# Altium footprint library Cyberdeck.PcbLib: 261 footprints (part 8 of 17)
Each footprint in its own frame and in the unit in brackets; x right, y up, seen from the top. Pads: shape width x height; smd on the part's side, far side on the other; paste and mask are expansions set on the pad; w line width, h text height; cw(c..) or ccw(c..) is an arc to the next point about the centre after c.
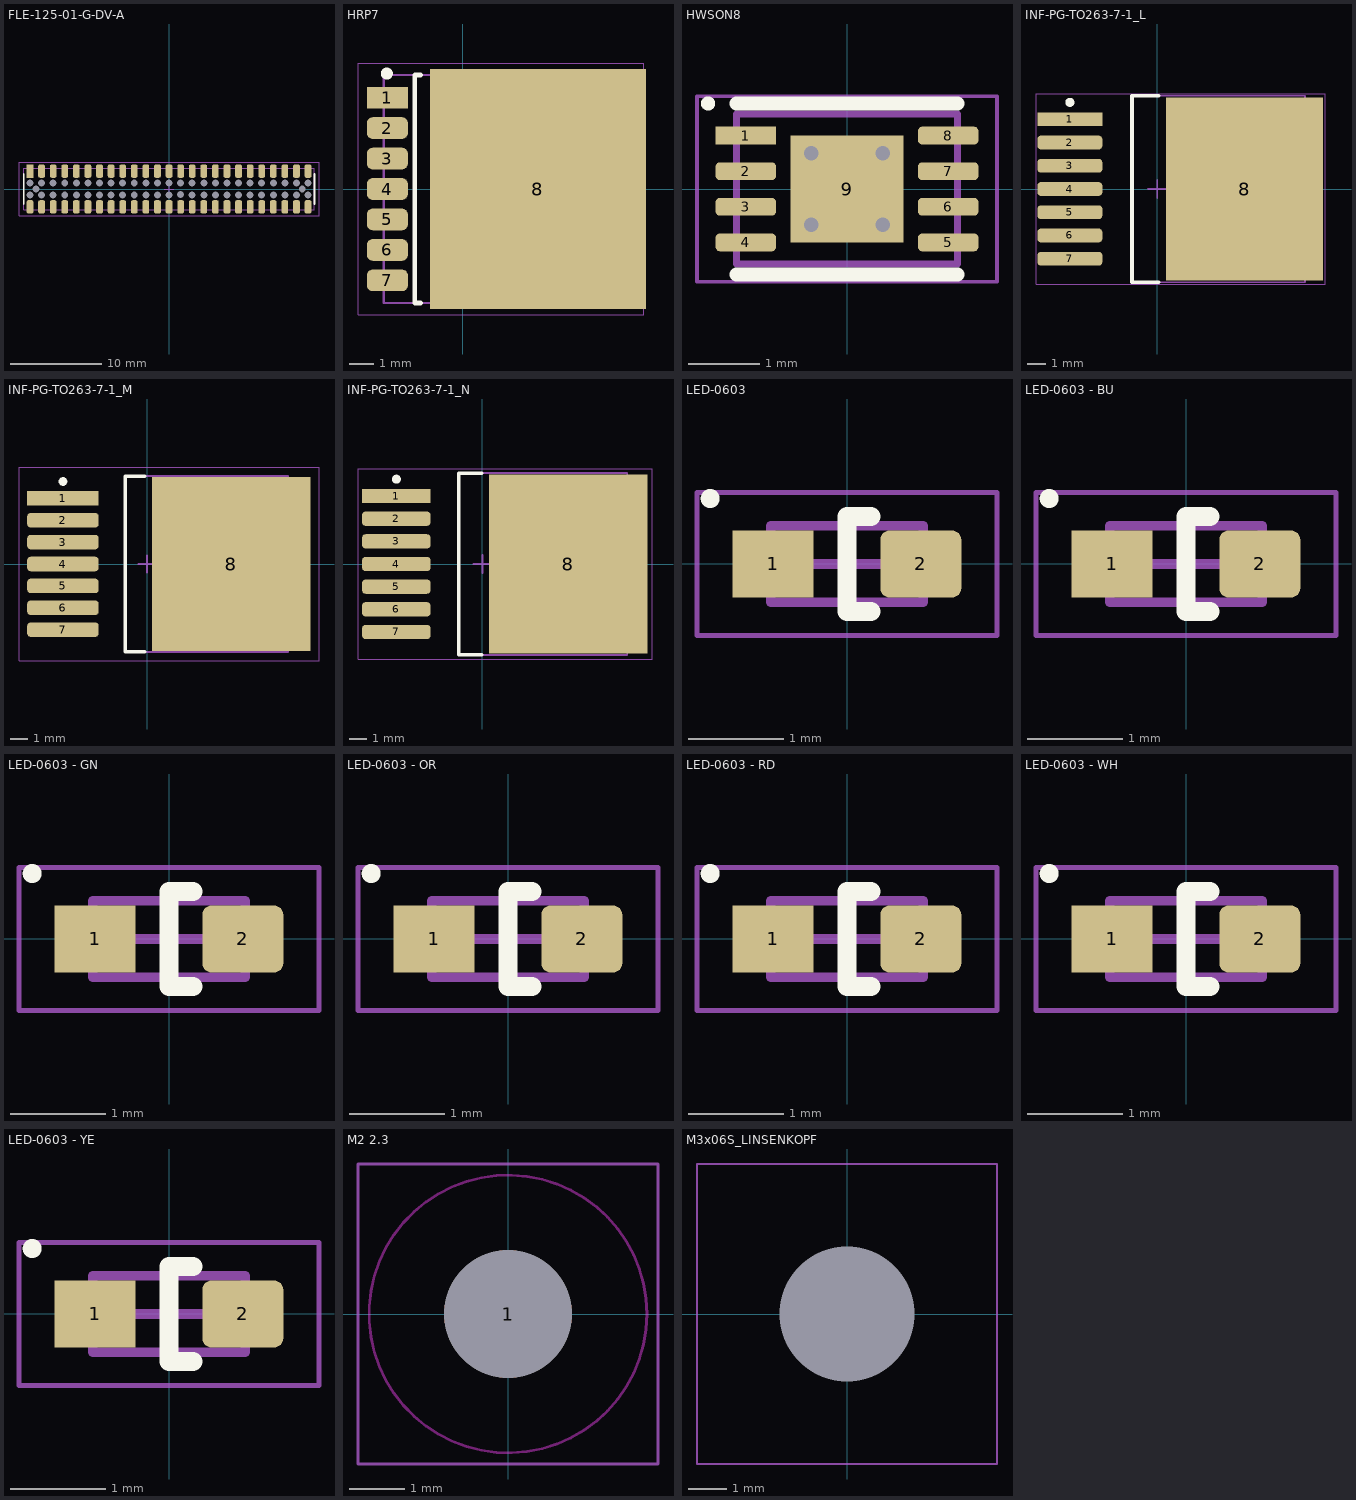
[diagram p7: the footprints below, top view; thin cyan lines are the x and y axes]

## FLE-125-01-G-DV-A [mil] "FLE-125-01-G-DV-A"
height 179.13
pads (102):
  rect 29x57 smd mask+2: 1(-600,77)
  rrect50% 29x57 smd mask+2: 2(-600,-77) 3(-550,77) 4(-550,-77) 5(-500,77) 6(-500,-77) 7(-450,77) 8(-450,-77) 9(-400,77) 10(-400,-77) 11(-350,77) 12(-350,-77) 13(-300,77) 14(-300,-77) 15(-250,77) 16(-250,-77) 17(-200,77) 18(-200,-77) 19(-150,77) 20(-150,-77) 21(-100,77) 22(-100,-77) 23(-50,77) 24(-50,-77) 25(0,77) 26(0,-77) 27(50,77) 28(50,-77) 29(100,77) 30(100,-77) 31(150,77) 32(150,-77) 33(200,77) 34(200,-77) 35(250,77) 36(250,-77) 37(300,77) 38(300,-77) 39(350,77) 40(350,-77) 41(400,77) 42(400,-77) 43(450,77) 44(450,-77) 45(500,77) 46(500,-77) 47(550,77) 48(550,-77) 49(600,77) 50(600,-77)
  round 0 hole 30 unplated: 51(-600,-25) 51(-600,25) 51(-575,0) 51(-550,-25) 51(-550,25) 51(-500,-25) 51(-500,25) 51(-450,-25) 51(-450,25) 51(-400,-25) 51(-400,25) 51(-350,-25) 51(-350,25) 51(-300,-25) 51(-300,25) 51(-250,-25) 51(-250,25) 51(-200,-25) 51(-200,25) 51(-150,-25) 51(-150,25) 51(-100,-25) 51(-100,25) 51(-50,-25) 51(-50,25) 51(0,-25) 51(0,25) 51(50,-23) 51(50,25) 51(100,-25) 51(100,25) 51(150,-25) 51(150,25) 51(200,-25) 51(200,25) 51(250,-25) 51(250,25) 51(300,-25) 51(300,25) 51(350,-25) 51(350,25) 51(400,-25) 51(400,25) 51(450,-25) 51(450,25) 51(500,-25) 51(500,25) 51(550,-25) 51(550,25) 51(600,-25) 51(600,25) 52(575,0)
Top Overlay:
  lines w7.87: -627.25,-65.5 -627.25,65.5 ; 627.25,-65.5 627.25,65.5
Assembly Top:
  lines w3.94: -627.25,-90.45 627.25,-90.45 627.25,90.45 -627.25,90.45 -627.25,-90.45
Courtyard Top:
  lines w1.97: -647.5,-115.5 647.25,-115.5 647.25,115.5 -647.5,115.5 -647.5,-115.5
  lines w3.94: -19.68,0 19.68,0 ; 0,-19.68 0,19.68
3D body "FLE-125-01-G-DV-A.stp": height 179.5, standoff -22.5, extent -627.25,-90.45 627.25,90.45

## HRP7 [mm] "HRP7"
height 2.1
pads (8):
  rect 1.7x0.9 smd: 1(-3.137,3.81)
  rrect50% 1.7x0.9 smd: 2(-3.137,2.54) 3(-3.137,1.27) 4(-3.137,0) 5(-3.137,-1.27) 6(-3.137,-2.54) 7(-3.137,-3.81)
  rect 9x10 smd: 8(3.137,0)
Top Overlay:
  circle w0.25: c-3.163,4.81 r0.125
  lines w0.2: -1.763,-4.75 -1.994,-4.75 -1.994,4.75 -1.763,4.75
Assembly Top:
  lines w0.1: -3.288,-4.75 -3.288,4.75 7.262,4.75 7.262,-4.75 -3.288,-4.75
Courtyard Top:
  lines w0.05: -4.363,-5.25 -4.363,5.25 7.537,5.25 7.537,-5.25 -4.363,-5.25
  lines w0.1: -0.5,0 0.5,0 ; 0,-0.5 0,0.5
3D body "HRP7.step": height 2.18, standoff 0, extent -3.264,-4.75 7.276,4.75

## HWSON8 [mm] "SON, 8-Leads, Body 2.00x3.00mm, Pitch 0.50mm, Thermal Pad 1.50x1.59mm, IPC Medium Density"
height 0.8
pads (9):
  rect 0.85x0.25 smd: 1(-1.42,0.75)
  rrect50% 0.85x0.25 smd: 2(-1.42,0.25) 3(-1.42,-0.25) 4(-1.42,-0.75) 5(1.42,-0.75) 6(1.42,-0.25) 7(1.42,0.25) 8(1.42,0.75)
  rect 1.59x1.5 smd: 9(0,0)
via -0.5,0.5 diameter 0.5 hole 0.2
via 0.5,0.5 diameter 0.5 hole 0.2
via -0.5,-0.5 diameter 0.5 hole 0.2
via 0.5,-0.5 diameter 0.5 hole 0.2
Top Overlay:
  circle w0.1: c-1.95,1.2 r0.05
  lines w0.2: -1.55,-1.2 1.55,-1.2 ; -1.55,1.2 1.55,1.2
Assembly Top:
  lines w0.1: -1.55,-1.05 -1.55,1.05 1.55,1.05 1.55,-1.05 -1.55,-1.05
Courtyard Top:
  lines w0.05: -2.105,-1.3 -2.105,1.3 2.105,1.3 2.105,-1.3 -2.105,-1.3
  lines w0.1: -0.5,0 0.5,0 ; 0,-0.5 0,0.5
3D body "HWSON8.step": height 0.8, standoff 0, extent -1.551,-1.05 1.551,1.05

## INF-PG-TO263-7-1_L [mm] "DPAK, 8-Leads, Body 10x9.25mm, Pitch 1.27mm, IPC High Density"
height 4.4
pads (8):
  rect 3.55x0.75 smd: 1(-4.775,3.81)
  rrect50% 3.55x0.75 smd: 2(-4.775,2.54) 3(-4.775,1.27) 4(-4.775,0) 5(-4.775,-1.27) 6(-4.775,-2.54) 7(-4.775,-3.81)
  rect 8.6x10 smd: 8(4.775,0)
Top Overlay:
  circle w0.25: c-4.775,4.735 r0.125
  lines w0.2: 0.075,-5.1 -1.375,-5.1 -1.375,5.1 0.075,5.1
Assembly Top:
  lines w0.1: -1.375,-5.1 -1.375,5.1 8.075,5.1 8.075,-5.1 -1.375,-5.1
Courtyard Top:
  lines w0.05: -6.625,-5.2 -6.625,5.2 9.175,5.2 9.175,-5.2 -6.625,-5.2
  lines w0.1: -0.5,0 0.5,0 ; 0,-0.5 0,0.5
3D body: height 4.4, standoff 0.1, extent -1.375,-5.1 8.075,5.1

## INF-PG-TO263-7-1_M [mm] "DPAK, 8-Leads, Body 10x9.25mm, Pitch 1.27mm, IPC Low Density"
height 4.4
pads (8):
  rect 4.15x0.85 smd: 1(-4.875,3.81)
  rrect50% 4.15x0.85 smd: 2(-4.875,2.54) 3(-4.875,1.27) 4(-4.875,0) 5(-4.875,-1.27) 6(-4.875,-2.54) 7(-4.875,-3.81)
  rect 9.2x10.1 smd: 8(4.875,0)
Top Overlay:
  circle w0.25: c-4.875,4.785 r0.125
  lines w0.2: -0.125,-5.1 -1.275,-5.1 -1.275,5.1 -0.125,5.1
Assembly Top:
  lines w0.1: -1.275,-5.1 8.175,-5.1 8.175,5.1 -1.275,5.1 -1.275,-5.1
Courtyard Top:
  lines w0.05: -7.425,-5.6 9.975,-5.6 9.975,5.6 -7.425,5.6 -7.425,-5.6
  lines w0.1: -0.5,0 0.5,0 ; 0,-0.5 0,0.5
3D body: height 4.4, standoff 0.1, extent -1.275,-5.1 8.175,5.1

## INF-PG-TO263-7-1_N [mm] "DPAK, 8-Leads, Body 10x9.25mm, Pitch 1.27mm, IPC Medium Density"
height 4.4
pads (8):
  rect 3.85x0.8 smd: 1(-4.825,3.81)
  rrect50% 3.85x0.8 smd: 2(-4.825,2.54) 3(-4.825,1.27) 4(-4.825,0) 5(-4.825,-1.27) 6(-4.825,-2.54) 7(-4.825,-3.81)
  rect 8.9x10.05 smd: 8(4.825,0)
Top Overlay:
  circle w0.25: c-4.825,4.76 r0.125
  lines w0.2: -0.025,-5.1 -1.325,-5.1 -1.325,5.1 -0.025,5.1
Assembly Top:
  lines w0.1: -1.325,-5.1 8.125,-5.1 8.125,5.1 -1.325,5.1 -1.325,-5.1
Courtyard Top:
  lines w0.05: -6.975,-5.35 9.525,-5.35 9.525,5.35 -6.975,5.35 -6.975,-5.35
  lines w0.1: -0.5,0 0.5,0 ; 0,-0.5 0,0.5
3D body: height 4.4, standoff 0.1, extent -1.325,-5.1 8.125,5.1

## Layerlegend [mm] "Layerlegend"
Top Layer:
  text "TOP" at -0.717,-1.1 h1.52
Mid-Layer 1:
  text "2" at -0.717,-1.1 h1.52
Mid-Layer 2:
  text "3" at -0.717,-1.1 h1.52
Bottom Layer:
  text "BOT" at 3.6,-0.846 h1.52

## LED-0603 [mm] "LED generic. 2-Leads, Body 1.6x0.8x0.95 mm"
height 0.95
pads (2):
  rect 0.85x0.7 smd: 1(-0.775,0)
  rrect25% 0.85x0.7 smd: 2(0.775,0)
Top Overlay:
  circle w0.1: c-1.437,0.687 r0.05
  lines w0.2: 0.25,-0.5 0,-0.5 0,0.5 0.25,0.5
Assembly Top:
  lines w0.1: -0.8,-0.4 -0.8,0.4 0.8,0.4 0.8,-0.4 -0.8,-0.4
Courtyard Top:
  lines w0.05: -1.575,-0.75 -1.575,0.75 1.575,0.75 1.575,-0.75 -1.575,-0.75
  lines w0.1: -0.5,0 0.5,0 ; 0,-0.5 0,0.5
3D body "STEP-WL-SMCW-0603-rev1.stp": height 0.7, standoff 0, extent -0.8,-0.4 0.8,0.4

## LED-0603 - BU [mm] "LED generic. 2-Leads, Body 1.6x0.8x0.95 mm"
height 0.95
pads (2):
  rect 0.85x0.7 smd: 1(-0.775,0)
  rrect25% 0.85x0.7 smd: 2(0.775,0)
Top Overlay:
  circle w0.1: c-1.437,0.687 r0.05
  lines w0.2: 0.25,-0.5 0,-0.5 0,0.5 0.25,0.5
Assembly Top:
  lines w0.1: -0.8,-0.4 -0.8,0.4 0.8,0.4 0.8,-0.4 -0.8,-0.4
Courtyard Top:
  lines w0.05: -1.575,-0.75 -1.575,0.75 1.575,0.75 1.575,-0.75 -1.575,-0.75
  lines w0.1: -0.5,0 0.5,0 ; 0,-0.5 0,0.5
3D body "User Library-Wurth Elektronik WL-SMCW 0603 (1608) LED Lens (Separate Body).STEP": height 0.7, standoff 0.3, extent -0.55,-0.4 0.55,0.4
3D body "User Library-Wurth Elektronik WL-SMCW 0603 (1608) LED Base (Separate Lens).STEP": height 0.64, standoff 0, extent -0.8,-0.4 0.8,0.4

## LED-0603 - GN [mm] "LED generic. 2-Leads, Body 1.6x0.8x0.95 mm"
height 0.95
pads (2):
  rect 0.85x0.7 smd: 1(-0.775,0)
  rrect25% 0.85x0.7 smd: 2(0.775,0)
Top Overlay:
  circle w0.1: c-1.437,0.687 r0.05
  lines w0.2: 0.25,-0.5 0,-0.5 0,0.5 0.25,0.5
Assembly Top:
  lines w0.1: -0.8,-0.4 -0.8,0.4 0.8,0.4 0.8,-0.4 -0.8,-0.4
Courtyard Top:
  lines w0.05: -1.575,-0.75 -1.575,0.75 1.575,0.75 1.575,-0.75 -1.575,-0.75
  lines w0.1: -0.5,0 0.5,0 ; 0,-0.5 0,0.5
3D body "User Library-Wurth Elektronik WL-SMCW 0603 (1608) LED Lens (Separate Body).STEP": height 0.7, standoff 0.3, extent -0.55,-0.4 0.55,0.4
3D body "User Library-Wurth Elektronik WL-SMCW 0603 (1608) LED Base (Separate Lens).STEP": height 0.64, standoff 0, extent -0.8,-0.4 0.8,0.4

## LED-0603 - OR [mm] "LED generic. 2-Leads, Body 1.6x0.8x0.95 mm"
height 0.95
pads (2):
  rect 0.85x0.7 smd: 1(-0.775,0)
  rrect25% 0.85x0.7 smd: 2(0.775,0)
Top Overlay:
  circle w0.1: c-1.437,0.687 r0.05
  lines w0.2: 0.25,-0.5 0,-0.5 0,0.5 0.25,0.5
Assembly Top:
  lines w0.1: -0.8,-0.4 -0.8,0.4 0.8,0.4 0.8,-0.4 -0.8,-0.4
Courtyard Top:
  lines w0.05: -1.575,-0.75 -1.575,0.75 1.575,0.75 1.575,-0.75 -1.575,-0.75
  lines w0.1: -0.5,0 0.5,0 ; 0,-0.5 0,0.5
3D body "User Library-Wurth Elektronik WL-SMCW 0603 (1608) LED Base (Separate Lens).STEP": height 0.64, standoff 0, extent -0.8,-0.4 0.8,0.4
3D body "User Library-Wurth Elektronik WL-SMCW 0603 (1608) LED Lens (Separate Body).STEP": height 0.7, standoff 0.3, extent -0.55,-0.4 0.55,0.4

## LED-0603 - RD [mm] "LED generic. 2-Leads, Body 1.6x0.8x0.95 mm"
height 0.95
pads (2):
  rect 0.85x0.7 smd: 1(-0.775,0)
  rrect25% 0.85x0.7 smd: 2(0.775,0)
Top Overlay:
  circle w0.1: c-1.437,0.687 r0.05
  lines w0.2: 0.25,-0.5 0,-0.5 0,0.5 0.25,0.5
Assembly Top:
  lines w0.1: -0.8,-0.4 -0.8,0.4 0.8,0.4 0.8,-0.4 -0.8,-0.4
Courtyard Top:
  lines w0.05: -1.575,-0.75 -1.575,0.75 1.575,0.75 1.575,-0.75 -1.575,-0.75
  lines w0.1: -0.5,0 0.5,0 ; 0,-0.5 0,0.5
3D body "User Library-Wurth Elektronik WL-SMCW 0603 (1608) LED Base (Separate Lens).STEP": height 0.64, standoff 0, extent -0.8,-0.4 0.8,0.4
3D body "User Library-Wurth Elektronik WL-SMCW 0603 (1608) LED Lens (Separate Body).STEP": height 0.7, standoff 0.3, extent -0.55,-0.4 0.55,0.4

## LED-0603 - WH [mm] "LED generic. 2-Leads, Body 1.6x0.8x0.95 mm"
height 0.95
pads (2):
  rect 0.85x0.7 smd: 1(-0.775,0)
  rrect25% 0.85x0.7 smd: 2(0.775,0)
Top Overlay:
  circle w0.1: c-1.437,0.687 r0.05
  lines w0.2: 0.25,-0.5 0,-0.5 0,0.5 0.25,0.5
Assembly Top:
  lines w0.1: -0.8,-0.4 -0.8,0.4 0.8,0.4 0.8,-0.4 -0.8,-0.4
Courtyard Top:
  lines w0.05: -1.575,-0.75 -1.575,0.75 1.575,0.75 1.575,-0.75 -1.575,-0.75
  lines w0.1: -0.5,0 0.5,0 ; 0,-0.5 0,0.5
3D body "User Library-Wurth Elektronik WL-SMCW 0603 (1608) LED Base (Separate Lens).STEP": height 0.64, standoff 0, extent -0.8,-0.4 0.8,0.4
3D body "User Library-Wurth Elektronik WL-SMCW 0603 (1608) LED Lens (Separate Body).STEP": height 0.7, standoff 0.3, extent -0.55,-0.4 0.55,0.4

## LED-0603 - YE [mm] "LED generic. 2-Leads, Body 1.6x0.8x0.95 mm"
height 0.95
pads (2):
  rect 0.85x0.7 smd: 1(-0.775,0)
  rrect25% 0.85x0.7 smd: 2(0.775,0)
Top Overlay:
  circle w0.1: c-1.437,0.687 r0.05
  lines w0.2: 0.25,-0.5 0,-0.5 0,0.5 0.25,0.5
Assembly Top:
  lines w0.1: -0.8,-0.4 0.8,-0.4 0.8,0.4 -0.8,0.4 -0.8,-0.4
Courtyard Top:
  lines w0.05: -1.575,-0.75 1.575,-0.75 1.575,0.75 -1.575,0.75 -1.575,-0.75
  lines w0.1: -0.5,0 0.5,0 ; 0,-0.5 0,0.5
3D body "User Library-Wurth Elektronik WL-SMCW 0603 (1608) LED Base (Separate Lens).STEP": height 0.64, standoff 0, extent -0.8,-0.4 0.8,0.4
3D body "User Library-Wurth Elektronik WL-SMCW 0603 (1608) LED Lens (Separate Body).STEP": height 0.7, standoff 0.3, extent -0.55,-0.4 0.55,0.4

## M2 2.3 [mm]
pads (1):
  round 2.3 hole 2.3 unplated: 1(0,0)
Keep-Out Layer:
  circle w0.05: c0,0 r2.5
Courtyard Top:
  lines w0.05: -2.7,-2.7 -2.7,2.7 2.7,2.7 2.7,-2.7 -2.7,-2.7
  lines w0.1: -0.5,0 0.5,0 ; 0,-0.5 0,0.5

## M3x06S_LINSENKOPF [mm]
height 3
pads (1):
  round 0 hole 3.5 unplated paste+0 mask+3.8: 15(0,0)
Courtyard Top:
  lines w0.05: -3.9,-3.9 3.9,-3.9 3.9,3.9 -3.9,3.9 -3.9,-3.9
  lines w0.1: -0.5,0 0.5,0 ; 0,-0.5 0,0.5